# Altium footprint library SMT IC footprints.PcbLib: 363 footprints (part 13 of 23)
Each footprint in its own frame and in the unit in brackets; x right, y up, seen from the top. Pads: shape width x height; smd on the part's side, far side on the other; paste and mask are expansions set on the pad; w line width, h text height; cw(c..) or ccw(c..) is an arc to the next point about the centre after c.
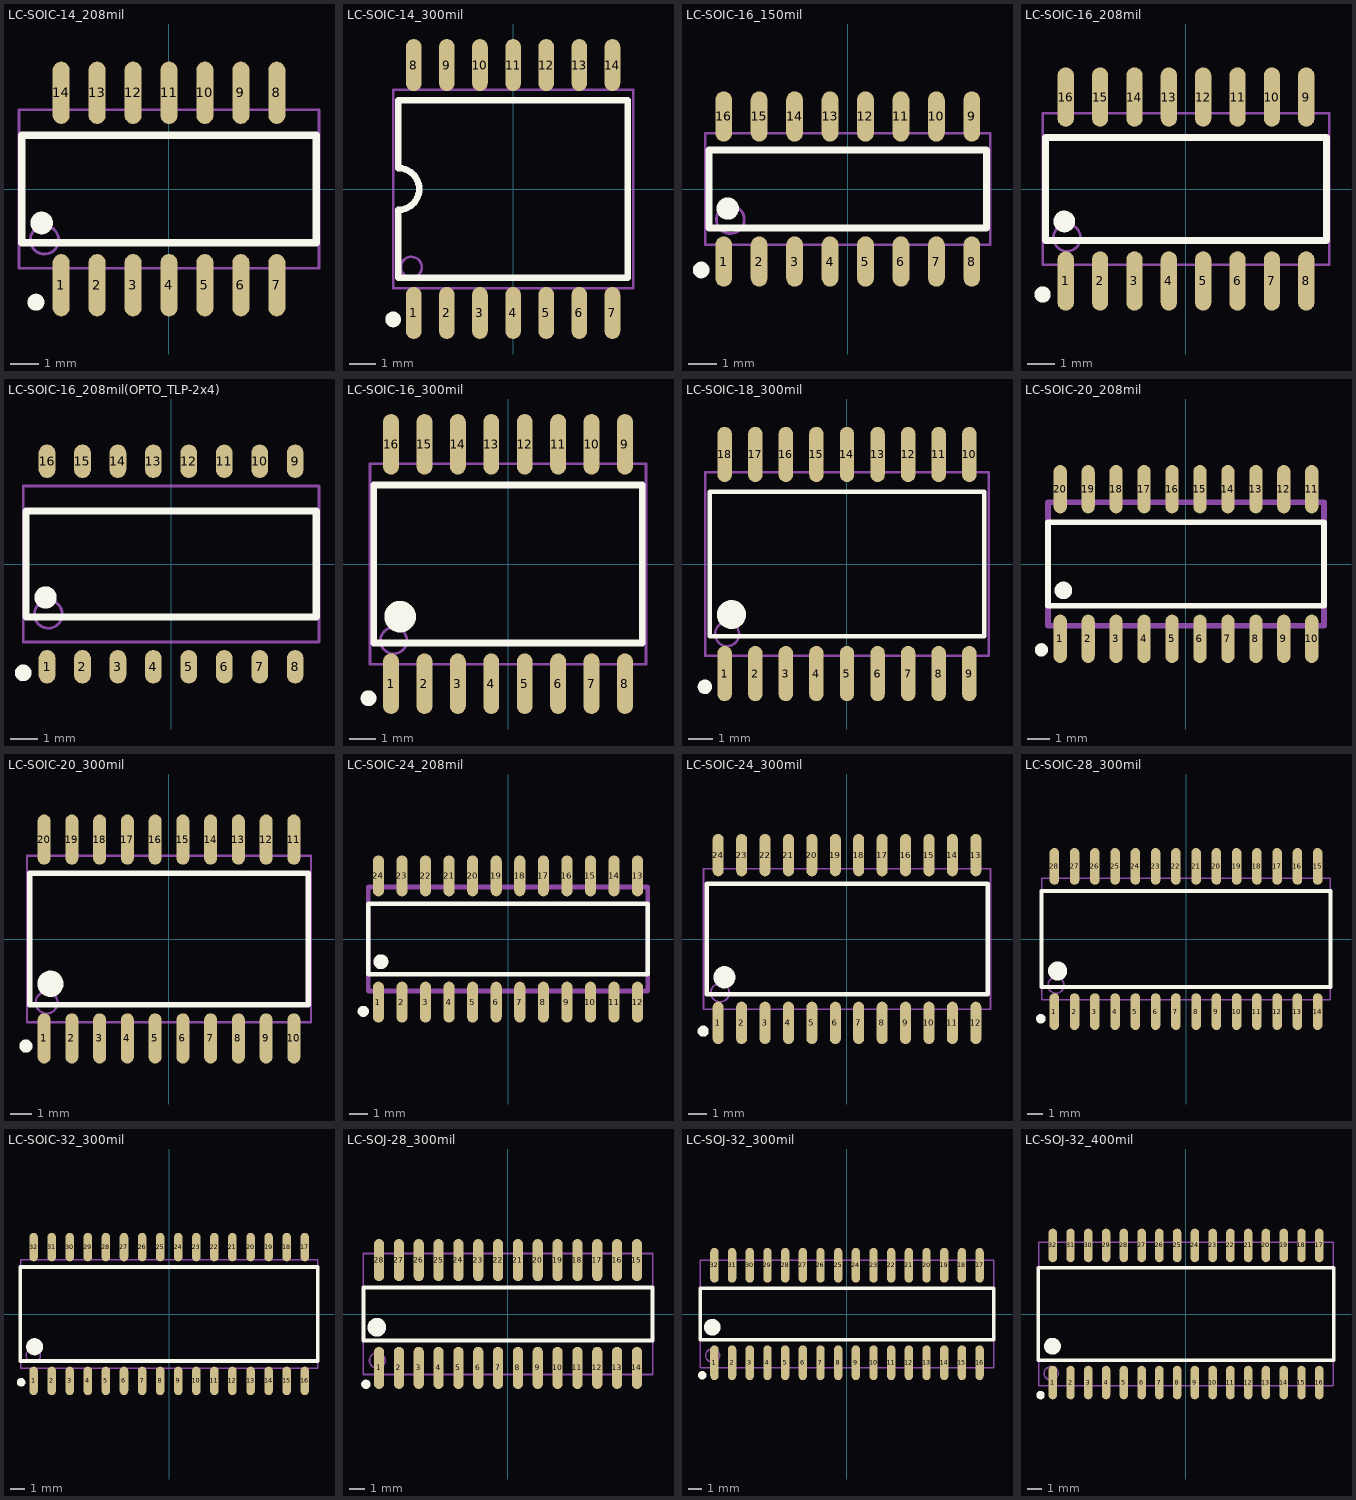
[diagram p12: the footprints below, top view; thin cyan lines are the x and y axes]

## LC-SOIC-14_208mil [mm]
pads (14):
  oval 0.6x2.2 smd: 1(-3.81,-3.4) 2(-2.54,-3.4) 3(-1.27,-3.4) 4(0,-3.4) 5(1.27,-3.4) 6(2.54,-3.4) 7(3.81,-3.4) 8(3.81,3.4) 9(2.54,3.4) 10(1.27,3.4) 11(0,3.4) 12(-1.27,3.4) 13(-2.54,3.4) 14(-3.81,3.4)
Top Overlay:
  circle w0.3: c-4.7,-4 r0.15
  circle w0.4: c-4.5,-1.2 r0.2
  lines w0.254: -5.2,-1.9 -5.2,1.9 5.2,1.9 5.2,-1.9 -5.2,-1.9
Mechanical 13:
  circle w0.1: c-4.4,-1.8 r0.5
  lines w0.1: -5.3,-2.8 -5.3,2.8 5.3,2.8 5.3,-2.8 -5.3,-2.8

## LC-SOIC-14_300mil [mm]
pads (14):
  oval 0.6x2 smd: 1(-3.81,-4.75) 2(-2.54,-4.75) 3(-1.27,-4.75) 4(0,-4.75) 5(1.27,-4.75) 6(2.54,-4.75) 7(3.81,-4.75) 8(-3.81,4.75) 9(-2.54,4.75) 10(-1.27,4.75) 11(0,4.75) 12(1.27,4.75) 13(2.54,4.75) 14(3.81,4.75)
Top Overlay:
  circle w0.3: c-4.6,-5 r0.15
  lines w0.254: -4.4,-3.4 -4.4,-0.8 ccw(c-4.4,0) -4.4,0.8 -4.4,3.4 4.4,3.4 4.4,-3.4 -4.4,-3.4
Mechanical 13:
  circle w0.1: c-3.9,-3 r0.4
  lines w0.1: -4.6,-3.8 -4.6,3.8 4.6,3.8 4.6,-3.8 -4.6,-3.8

## LC-SOIC-16_150mil [mm]
pads (16):
  oval 0.6x1.8 smd: 1(-4.445,-2.6) 2(-3.175,-2.6) 3(-1.905,-2.6) 4(-0.635,-2.6) 5(0.635,-2.6) 6(1.905,-2.6) 7(3.175,-2.6) 8(4.445,-2.6) 9(4.445,2.6) 10(3.175,2.6) 11(1.905,2.6) 12(0.635,2.6) 13(-0.635,2.6) 14(-1.905,2.6) 15(-3.175,2.6) 16(-4.445,2.6)
Top Overlay:
  circle w0.4: c-4.3,-0.7 r0.2
  circle w0.3: c-5.25,-2.9 r0.15
  lines w0.254: -4.975,-1.4 -4.975,1.4 4.975,1.4 4.975,-1.4 -4.975,-1.4
Mechanical 13:
  circle w0.1: c-4.205,-1.095 r0.5
  lines w0.1: -5.105,-1.995 -5.105,1.995 5.105,1.995 5.105,-1.995 -5.105,-1.995
3D body "SOIC-16-150mil.SLDPRT": height 1.4, standoff 0, extent -4.95,-3 4.95,3

## LC-SOIC-16_208mil [mm]
pads (16):
  oval 0.6x2.2 smd: 1(-4.445,-3.4) 2(-3.175,-3.4) 3(-1.905,-3.4) 4(-0.635,-3.4) 5(0.635,-3.4) 6(1.905,-3.4) 7(3.175,-3.4) 8(4.445,-3.4) 9(4.445,3.4) 10(3.175,3.4) 11(1.905,3.4) 12(0.635,3.4) 13(-0.635,3.4) 14(-1.905,3.4) 15(-3.175,3.4) 16(-4.445,3.4)
Top Overlay:
  circle w0.4: c-4.5,-1.2 r0.2
  circle w0.3: c-5.3,-3.9 r0.15
  lines w0.254: -5.2,-1.9 -5.2,1.9 5.2,1.9 5.2,-1.9 -5.2,-1.9
Mechanical 13:
  circle w0.1: c-4.4,-1.8 r0.5
  lines w0.1: -5.3,-2.8 -5.3,2.8 5.3,2.8 5.3,-2.8 -5.3,-2.8
3D body "SOP16_208mil (5.3mm)_Foot SOP16.sldprt": height 1.2, standoff 0, extent 4.23,2.647 4.66,3.957
3D body "SOP16_208mil (5.3mm)_Foot SOP16.sldprt": height 1.2, standoff 0, extent 2.96,2.647 3.39,3.957
3D body "SOP16_208mil (5.3mm)_Foot SOP16.sldprt": height 1.2, standoff 0, extent 1.69,2.647 2.12,3.957
3D body "SOP16_208mil (5.3mm)_Foot SOP16.sldprt": height 1.2, standoff 0, extent 0.42,2.647 0.85,3.957
3D body "SOP16_208mil (5.3mm)_Foot SOP16.sldprt": height 1.2, standoff 0, extent -0.85,2.647 -0.42,3.957
3D body "SOP16_208mil (5.3mm)_Foot SOP16.sldprt": height 1.2, standoff 0, extent -4.66,2.647 -4.23,3.957
3D body "SOP16_208mil (5.3mm)_Foot SOP16.sldprt": height 1.2, standoff 0, extent -3.39,2.647 -2.96,3.957
3D body "SOP16_208mil (5.3mm)_Foot SOP16.sldprt": height 1.2, standoff 0, extent -2.12,2.647 -1.69,3.957
3D body "SOP16_208mil (5.3mm)_Foot SOP16.sldprt": height 1.2, standoff 0, extent 1.69,-3.957 2.12,-2.647
3D body "SOP16_208mil (5.3mm)_Foot SOP16.sldprt": height 1.2, standoff 0, extent 2.96,-3.957 3.39,-2.647
3D body "SOP16_208mil (5.3mm)_Foot SOP16.sldprt": height 1.2, standoff 0, extent 4.23,-3.957 4.66,-2.647
3D body "SOP16_208mil (5.3mm)_Foot SOP16.sldprt": height 1.2, standoff 0, extent 0.42,-3.957 0.85,-2.647
3D body "SOP16_208mil (5.3mm)_Foot SOP16.sldprt": height 1.2, standoff 0, extent -0.85,-3.957 -0.42,-2.647
3D body "SOP16_208mil (5.3mm)_Foot SOP16.sldprt": height 1.2, standoff 0, extent -2.12,-3.957 -1.69,-2.647
3D body "SOP16_208mil (5.3mm)_Foot SOP16.sldprt": height 1.2, standoff 0, extent -3.39,-3.957 -2.96,-2.647
3D body "SOP16_208mil (5.3mm)_Foot SOP16.sldprt": height 1.2, standoff 0, extent -4.66,-3.957 -4.23,-2.647
3D body "SOP16_208mil (5.3mm)_SOP16 Body.sldprt": height 1.8, standoff 0, extent -5.1,-2.65 5.1,2.65

## LC-SOIC-16_208mil(OPTO_TLP-2x4) [mm]
pads (16):
  oval 0.6x1.2 smd: 1(-4.445,-3.683) 2(-3.175,-3.683) 3(-1.905,-3.683) 4(-0.635,-3.683) 5(0.635,-3.683) 6(1.905,-3.683) 7(3.175,-3.683) 8(4.445,-3.683) 9(4.445,3.683) 10(3.175,3.683) 11(1.905,3.683) 12(0.635,3.683) 13(-0.635,3.683) 14(-1.905,3.683) 15(-3.175,3.683) 16(-4.445,3.683)
Top Overlay:
  circle w0.4: c-4.5,-1.2 r0.2
  circle w0.3: c-5.3,-3.9 r0.15
  lines w0.254: -5.2,-1.9 -5.2,1.9 5.2,1.9 5.2,-1.9 -5.2,-1.9
Mechanical 13:
  circle w0.1: c-4.4,-1.8 r0.5
  lines w0.1: -5.3,-2.8 -5.3,2.8 5.3,2.8 5.3,-2.8 -5.3,-2.8
3D body "SOP16_208mil (5.3mm)_Foot SOP16.sldprt": height 1.2, standoff 0, extent 4.23,2.647 4.66,3.957
3D body "SOP16_208mil (5.3mm)_Foot SOP16.sldprt": height 1.2, standoff 0, extent 2.96,2.647 3.39,3.957
3D body "SOP16_208mil (5.3mm)_Foot SOP16.sldprt": height 1.2, standoff 0, extent 1.69,2.647 2.12,3.957
3D body "SOP16_208mil (5.3mm)_Foot SOP16.sldprt": height 1.2, standoff 0, extent 0.42,2.647 0.85,3.957
3D body "SOP16_208mil (5.3mm)_Foot SOP16.sldprt": height 1.2, standoff 0, extent -0.85,2.647 -0.42,3.957
3D body "SOP16_208mil (5.3mm)_Foot SOP16.sldprt": height 1.2, standoff 0, extent -4.66,2.647 -4.23,3.957
3D body "SOP16_208mil (5.3mm)_Foot SOP16.sldprt": height 1.2, standoff 0, extent -3.39,2.647 -2.96,3.957
3D body "SOP16_208mil (5.3mm)_Foot SOP16.sldprt": height 1.2, standoff 0, extent -2.12,2.647 -1.69,3.957
3D body "SOP16_208mil (5.3mm)_Foot SOP16.sldprt": height 1.2, standoff 0, extent 1.69,-3.957 2.12,-2.647
3D body "SOP16_208mil (5.3mm)_Foot SOP16.sldprt": height 1.2, standoff 0, extent 2.96,-3.957 3.39,-2.647
3D body "SOP16_208mil (5.3mm)_Foot SOP16.sldprt": height 1.2, standoff 0, extent 4.23,-3.957 4.66,-2.647
3D body "SOP16_208mil (5.3mm)_Foot SOP16.sldprt": height 1.2, standoff 0, extent 0.42,-3.957 0.85,-2.647
3D body "SOP16_208mil (5.3mm)_Foot SOP16.sldprt": height 1.2, standoff 0, extent -0.85,-3.957 -0.42,-2.647
3D body "SOP16_208mil (5.3mm)_Foot SOP16.sldprt": height 1.2, standoff 0, extent -2.12,-3.957 -1.69,-2.647
3D body "SOP16_208mil (5.3mm)_Foot SOP16.sldprt": height 1.2, standoff 0, extent -3.39,-3.957 -2.96,-2.647
3D body "SOP16_208mil (5.3mm)_Foot SOP16.sldprt": height 1.2, standoff 0, extent -4.66,-3.957 -4.23,-2.647
3D body "SOP16_208mil (5.3mm)_SOP16 Body.sldprt": height 1.8, standoff 0, extent -5.1,-2.65 5.1,2.65

## LC-SOIC-16_300mil [mm]
pads (16):
  oval 0.6x2.3 smd: 1(-4.445,-4.55) 2(-3.175,-4.55) 3(-1.905,-4.55) 4(-0.635,-4.55) 5(0.635,-4.55) 6(1.905,-4.55) 7(3.175,-4.55) 8(4.445,-4.55) 9(4.445,4.55) 10(3.175,4.55) 11(1.905,4.55) 12(0.635,4.55) 13(-0.635,4.55) 14(-1.905,4.55) 15(-3.175,4.55) 16(-4.445,4.55)
Top Overlay:
  circle w0.3: c-5.3,-5.1 r0.15
  circle w0.6: c-4.1,-2 r0.3
  lines w0.254: -5.1,-3 5.1,-3 5.1,3 -5.1,3 -5.1,-3
Mechanical 13:
  circle w0.1: c-4.345,-2.91 r0.5
  lines w0.1: -5.245,-3.81 5.245,-3.81 5.245,3.81 -5.245,3.81 -5.245,-3.81
3D body "SOIC-16-300_SOIC_300_SOIC_10.5X7.6_1.sldprt": height 2.47, standoff 0.13, extent -5.25,-3.8 5.25,3.8
3D body "SOIC-16-300_pin_SOIC_SO-300_1.sldprt": height 1.53, standoff -0.03, extent -4.65,-5.3 -4.25,-3.8
3D body "SOIC-16-300_pin_SOIC_SO-300_1.sldprt": height 1.53, standoff -0.03, extent -3.38,-5.3 -2.98,-3.8
3D body "SOIC-16-300_pin_SOIC_SO-300_1.sldprt": height 1.53, standoff -0.03, extent -2.11,-5.3 -1.71,-3.8
3D body "SOIC-16-300_pin_SOIC_SO-300_1.sldprt": height 1.53, standoff -0.03, extent -0.84,-5.3 -0.44,-3.8
3D body "SOIC-16-300_pin_SOIC_SO-300_1.sldprt": height 1.53, standoff -0.03, extent 0.43,-5.3 0.83,-3.8
3D body "SOIC-16-300_pin_SOIC_SO-300_1.sldprt": height 1.53, standoff -0.03, extent 1.7,-5.3 2.1,-3.8
3D body "SOIC-16-300_pin_SOIC_SO-300_1.sldprt": height 1.53, standoff -0.03, extent 2.97,-5.3 3.37,-3.8
3D body "SOIC-16-300_pin_SOIC_SO-300_1.sldprt": height 1.53, standoff -0.03, extent 4.24,-5.3 4.64,-3.8
3D body "SOIC-16-300_pin_SOIC_SO-300_1.sldprt": height 1.53, standoff -0.03, extent 4.25,3.8 4.65,5.3
3D body "SOIC-16-300_pin_SOIC_SO-300_1.sldprt": height 1.53, standoff -0.03, extent 2.98,3.8 3.38,5.3
3D body "SOIC-16-300_pin_SOIC_SO-300_1.sldprt": height 1.53, standoff -0.03, extent 1.71,3.8 2.11,5.3
3D body "SOIC-16-300_pin_SOIC_SO-300_1.sldprt": height 1.53, standoff -0.03, extent 0.44,3.8 0.84,5.3
3D body "SOIC-16-300_pin_SOIC_SO-300_1.sldprt": height 1.53, standoff -0.03, extent -0.83,3.8 -0.43,5.3
3D body "SOIC-16-300_pin_SOIC_SO-300_1.sldprt": height 1.53, standoff -0.03, extent -2.1,3.8 -1.7,5.3
3D body "SOIC-16-300_pin_SOIC_SO-300_1.sldprt": height 1.53, standoff -0.03, extent -3.37,3.8 -2.97,5.3
3D body "SOIC-16-300_pin_SOIC_SO-300_1.sldprt": height 1.53, standoff -0.03, extent -4.64,3.8 -4.24,5.3

## LC-SOIC-18_300mil [mm]
pads (18):
  oval 0.6x2.3 smd: 1(-5.08,-4.55) 2(-3.81,-4.55) 3(-2.54,-4.55) 4(-1.27,-4.55) 5(0,-4.55) 6(1.27,-4.55) 7(2.54,-4.55) 8(3.81,-4.55) 9(5.08,-4.55) 10(5.08,4.55) 11(3.81,4.55) 12(2.54,4.55) 13(1.27,4.55) 14(0,4.55) 15(-1.27,4.55) 16(-2.54,4.55) 17(-3.81,4.55) 18(-5.08,4.55)
Top Overlay:
  circle w0.6: c-4.8,-2.1 r0.3
  circle w0.3: c-5.9,-5.1 r0.15
  lines w0.2: -5.7,-3 5.7,-3 5.7,3 -5.7,3 -5.7,-3
Mechanical 13:
  circle w0.1: c-4.98,-2.91 r0.5
  lines w0.1: -5.88,-3.81 -5.88,3.81 5.88,3.81 5.88,-3.81 -5.88,-3.81
3D body "SOIC-18-300mil.sldprt": height 2.47, standoff 0.13, extent -5.875,-3.8 5.875,3.8
3D body "SOIC-18-300mil pin.sldprt": height 1.53, standoff -0.03, extent -5.28,-5.309 -4.88,-3.809
3D body "SOIC-18-300mil pin.sldprt": height 1.53, standoff -0.03, extent -4.01,-5.309 -3.61,-3.809
3D body "SOIC-18-300mil pin.sldprt": height 1.53, standoff -0.03, extent -2.74,-5.309 -2.34,-3.809
3D body "SOIC-18-300mil pin.sldprt": height 1.53, standoff -0.03, extent -1.47,-5.309 -1.07,-3.809
3D body "SOIC-18-300mil pin.sldprt": height 1.53, standoff -0.03, extent 3.61,-5.309 4.01,-3.809
3D body "SOIC-18-300mil pin.sldprt": height 1.53, standoff -0.03, extent 2.34,-5.309 2.74,-3.809
3D body "SOIC-18-300mil pin.sldprt": height 1.53, standoff -0.03, extent 1.07,-5.309 1.47,-3.809
3D body "SOIC-18-300mil pin.sldprt": height 1.53, standoff -0.03, extent -0.2,-5.309 0.2,-3.809
3D body "SOIC-18-300mil pin.sldprt": height 1.53, standoff -0.03, extent 4.88,-5.309 5.28,-3.809
3D body "SOIC-18-300mil pin.sldprt": height 1.53, standoff -0.03, extent -5.28,3.809 -4.88,5.309
3D body "SOIC-18-300mil pin.sldprt": height 1.53, standoff -0.03, extent -0.2,3.809 0.2,5.309
3D body "SOIC-18-300mil pin.sldprt": height 1.53, standoff -0.03, extent -1.47,3.809 -1.07,5.309
3D body "SOIC-18-300mil pin.sldprt": height 1.53, standoff -0.03, extent -2.74,3.809 -2.34,5.309
3D body "SOIC-18-300mil pin.sldprt": height 1.53, standoff -0.03, extent -4.01,3.809 -3.61,5.309
3D body "SOIC-18-300mil pin.sldprt": height 1.53, standoff -0.03, extent 1.07,3.809 1.47,5.309
3D body "SOIC-18-300mil pin.sldprt": height 1.53, standoff -0.03, extent 2.34,3.809 2.74,5.309
3D body "SOIC-18-300mil pin.sldprt": height 1.53, standoff -0.03, extent 3.61,3.809 4.01,5.309
3D body "SOIC-18-300mil pin.sldprt": height 1.53, standoff -0.03, extent 4.88,3.809 5.28,5.309

## LC-SOIC-20_208mil [mm]
pads (20):
  oval 0.6x2.2 smd: 1(-5.715,-3.4) 2(-4.445,-3.4) 3(-3.175,-3.4) 4(-1.905,-3.4) 5(-0.635,-3.4) 6(0.635,-3.4) 7(1.905,-3.4) 8(3.175,-3.4) 9(4.445,-3.4) 10(5.715,-3.4) 11(5.715,3.4) 12(4.445,3.4) 13(3.175,3.4) 14(1.905,3.4) 15(0.635,3.4) 16(-0.635,3.4) 17(-1.905,3.4) 18(-3.175,3.4) 19(-4.445,3.4) 20(-5.715,3.4)
Top Overlay:
  circle w0.4: c-5.57,-1.2 r0.2
  circle w0.3: c-6.57,-3.9 r0.15
  lines w0.254: -6.27,-1.9 -6.27,1.9 6.27,1.9 6.27,-1.9 -6.27,-1.9
Mechanical 13:
  lines w0.254: -6.27,-2.8 -6.27,2.8 6.27,2.8 6.27,-2.8 -6.27,-2.8
3D body "SOIC-20-208mil.SLDPRT": height 2, standoff 0, extent -6.45,-3.9 6.45,3.9

## LC-SOIC-20_300mil [mm]
pads (20):
  oval 0.6x2.3 smd: 1(-5.715,-4.55) 2(-4.445,-4.55) 3(-3.175,-4.55) 4(-1.905,-4.55) 5(-0.635,-4.55) 6(0.635,-4.55) 7(1.905,-4.55) 8(3.175,-4.55) 9(4.445,-4.55) 10(5.715,-4.55) 11(5.715,4.55) 12(4.445,4.55) 13(3.175,4.55) 14(1.905,4.55) 15(0.635,4.55) 16(-0.635,4.55) 17(-1.905,4.55) 18(-3.175,4.55) 19(-4.445,4.55) 20(-5.715,4.55)
Top Overlay:
  circle w0.3: c-6.55,-4.9 r0.15
  circle w0.6: c-5.425,-2.05 r0.3
  lines w0.254: -6.375,-3 -6.375,3 6.375,3 6.375,-3 -6.375,-3
Mechanical 13:
  circle w0.1: c-5.6,-2.91 r0.5
  lines w0.1: -6.5,-3.81 -6.5,3.81 6.5,3.81 6.5,-3.81 -6.5,-3.81
3D body "SOIC-20-300mil.SLDPRT": height 2.66, standoff 0, extent -6.5,-5.315 6.5,5.315

## LC-SOIC-24_208mil [mm]
pads (24):
  oval 0.6x2.2 smd: 1(-6.985,-3.4) 2(-5.715,-3.4) 3(-4.445,-3.4) 4(-3.175,-3.4) 5(-1.905,-3.4) 6(-0.635,-3.4) 7(0.635,-3.4) 8(1.905,-3.4) 9(3.175,-3.4) 10(4.445,-3.4) 11(5.715,-3.4) 12(6.985,-3.4) 13(6.985,3.4) 14(5.715,3.4) 15(4.445,3.4) 16(3.175,3.4) 17(1.905,3.4) 18(0.635,3.4) 19(-0.635,3.4) 20(-1.905,3.4) 21(-3.175,3.4) 22(-4.445,3.4) 23(-5.715,3.4) 24(-6.985,3.4)
Top Overlay:
  circle w0.3: c-7.8,-3.9 r0.15
  circle w0.4: c-6.85,-1.225 r0.2
  lines w0.254: -7.54,-1.9 7.54,-1.9 7.54,1.9 -7.54,1.9 -7.54,-1.9
Mechanical 13:
  lines w0.254: -7.54,-2.8 7.54,-2.8 7.54,2.8 -7.54,2.8 -7.54,-2.8

## LC-SOIC-24_300mil [mm]
pads (24):
  oval 0.6x2.3 smd: 1(-6.985,-4.55) 2(-5.715,-4.55) 3(-4.445,-4.55) 4(-3.175,-4.55) 5(-1.905,-4.55) 6(-0.635,-4.55) 7(0.635,-4.55) 8(1.905,-4.55) 9(3.175,-4.55) 10(4.445,-4.55) 11(5.715,-4.55) 12(6.985,-4.55) 13(6.985,4.55) 14(5.715,4.55) 15(4.445,4.55) 16(3.175,4.55) 17(1.905,4.55) 18(0.635,4.55) 19(-0.635,4.55) 20(-1.905,4.55) 21(-3.175,4.55) 22(-4.445,4.55) 23(-5.715,4.55) 24(-6.985,4.55)
Top Overlay:
  circle w0.6: c-6.65,-2.075 r0.3
  circle w0.3: c-7.8,-5 r0.15
  lines w0.254: -7.6,-3 -7.6,3 7.625,3 7.625,-3 -7.6,-3
Mechanical 13:
  circle w0.1: c-6.885,-2.91 r0.5
  lines w0.1: -7.785,-3.81 -7.785,3.81 7.785,3.81 7.785,-3.81 -7.785,-3.81
3D body "SOIC-24-300.SLDPRT": height 2.65, standoff 0, extent -7.75,-5.15 7.75,5.15

## LC-SOIC-28_300mil [mm]
pads (28):
  oval 0.6x2.3 smd: 1(-8.255,-4.55) 2(-6.985,-4.55) 3(-5.715,-4.55) 4(-4.445,-4.55) 5(-3.175,-4.55) 6(-1.905,-4.55) 7(-0.635,-4.55) 8(0.635,-4.55) 9(1.905,-4.55) 10(3.175,-4.55) 11(4.445,-4.55) 12(5.715,-4.55) 13(6.985,-4.55) 14(8.255,-4.55) 15(8.255,4.55) 16(6.985,4.55) 17(5.715,4.55) 18(4.445,4.55) 19(3.175,4.55) 20(1.905,4.55) 21(0.635,4.55) 22(-0.635,4.55) 23(-1.905,4.55) 24(-3.175,4.55) 25(-4.445,4.55) 26(-5.715,4.55) 27(-6.985,4.55) 28(-8.255,4.55)
Top Overlay:
  circle w0.3: c-9.1,-5 r0.15
  circle w0.6: c-8.05,-2 r0.3
  lines w0.254: -9.05,-3 -9.05,3 9.05,3 9.05,-3 -9.05,-3
Mechanical 13:
  circle w0.1: c-8.15,-2.9 r0.5
  lines w0.1: -9.05,-3.8 -9.05,3.8 9.05,3.8 9.05,-3.8 -9.05,-3.8

## LC-SOIC-32_300mil [mm]
pads (32):
  oval 0.6x2 smd: 1(-9.525,-4.7) 2(-8.255,-4.7) 3(-6.985,-4.7) 4(-5.715,-4.7) 5(-4.445,-4.7) 6(-3.175,-4.7) 7(-1.905,-4.7) 8(-0.635,-4.7) 9(0.635,-4.7) 10(1.905,-4.7) 11(3.175,-4.7) 12(4.445,-4.7) 13(5.715,-4.7) 14(6.985,-4.7) 15(8.255,-4.7) 16(9.525,-4.7) 17(9.525,4.7) 18(8.255,4.7) 19(6.985,4.7) 20(5.715,4.7) 21(4.445,4.7) 22(3.175,4.7) 23(1.905,4.7) 24(0.635,4.7) 25(-0.635,4.7) 26(-1.905,4.7) 27(-3.175,4.7) 28(-4.445,4.7) 29(-5.715,4.7) 30(-6.985,4.7) 31(-8.255,4.7) 32(-9.525,4.7)
Top Overlay:
  circle w0.6: c-9.45,-2.3 r0.3
  circle w0.3: c-10.4,-4.8 r0.15
  lines w0.254: -10.45,-3.3 -10.45,3.3 10.45,3.3 10.45,-3.3 -10.45,-3.3
Mechanical 13:
  circle w0.1: c-9.54,-2.9 r0.5
  lines w0.1: -10.44,-3.8 -10.44,3.8 10.44,3.8 10.44,-3.8 -10.44,-3.8

## LC-SOJ-28_300mil [mm]
pads (28):
  oval 0.65x2.7 smd: 1(-8.255,-3.45) 2(-6.985,-3.45) 3(-5.715,-3.45) 4(-4.445,-3.45) 5(-3.175,-3.45) 6(-1.905,-3.45) 7(-0.635,-3.45) 8(0.635,-3.45) 9(1.905,-3.45) 10(3.175,-3.45) 11(4.445,-3.45) 12(5.715,-3.45) 13(6.985,-3.45) 14(8.255,-3.45) 15(8.255,3.45) 16(6.985,3.45) 17(5.715,3.45) 18(4.445,3.45) 19(3.175,3.45) 20(1.905,3.45) 21(0.635,3.45) 22(-0.635,3.45) 23(-1.905,3.45) 24(-3.175,3.45) 25(-4.445,3.45) 26(-5.715,3.45) 27(-6.985,3.45) 28(-8.255,3.45)
Top Overlay:
  circle w0.6: c-8.4,-0.85 r0.3
  circle w0.3: c-9.1,-4.5 r0.15
  lines w0.254: -9.25,-1.7 9.25,-1.7 9.25,1.7 -9.25,1.7 -9.25,-1.7
Mechanical 13:
  circle w0.1: c-8.37,-2.975 r0.5
  lines w0.1: -9.27,-3.875 9.27,-3.875 9.27,3.875 -9.27,3.875 -9.27,-3.875

## LC-SOJ-32_300mil [mm]
pads (32):
  oval 0.6x2.5 smd: 1(-9.525,-3.5) 2(-8.255,-3.5) 3(-6.985,-3.5) 4(-5.715,-3.5) 5(-4.445,-3.5) 6(-3.175,-3.5) 7(-1.905,-3.5) 8(-0.635,-3.5) 9(0.635,-3.5) 10(1.905,-3.5) 11(3.175,-3.5) 12(4.445,-3.5) 13(5.715,-3.5) 14(6.985,-3.5) 15(8.255,-3.5) 16(9.525,-3.5) 17(9.525,3.5) 18(8.255,3.5) 19(6.985,3.5) 20(5.715,3.5) 21(4.445,3.5) 22(3.175,3.5) 23(1.905,3.5) 24(0.635,3.5) 25(-0.635,3.5) 26(-1.905,3.5) 27(-3.175,3.5) 28(-4.445,3.5) 29(-5.715,3.5) 30(-6.985,3.5) 31(-8.255,3.5) 32(-9.525,3.5)
Top Overlay:
  circle w0.3: c-10.4,-4.4 r0.15
  circle w0.6: c-9.675,-0.95 r0.3
  lines w0.254: -10.55,-1.85 10.55,-1.85 10.55,1.85 -10.55,1.85 -10.55,-1.85
Mechanical 13:
  circle w0.1: c-9.645,-2.975 r0.5
  lines w0.1: -10.545,-3.875 10.545,-3.875 10.545,3.875 -10.545,3.875 -10.545,-3.875

## LC-SOJ-32_400mil [mm]
pads (32):
  oval 0.6x2.4 smd: 1(-9.525,-4.9) 2(-8.255,-4.9) 3(-6.985,-4.9) 4(-5.715,-4.9) 5(-4.445,-4.9) 6(-3.175,-4.9) 7(-1.905,-4.9) 8(-0.635,-4.9) 9(0.635,-4.9) 10(1.905,-4.9) 11(3.175,-4.9) 12(4.445,-4.9) 13(5.715,-4.9) 14(6.985,-4.9) 15(8.255,-4.9) 16(9.525,-4.9) 17(9.525,4.9) 18(8.255,4.9) 19(6.985,4.9) 20(5.715,4.9) 21(4.445,4.9) 22(3.175,4.9) 23(1.905,4.9) 24(0.635,4.9) 25(-0.635,4.9) 26(-1.905,4.9) 27(-3.175,4.9) 28(-4.445,4.9) 29(-5.715,4.9) 30(-6.985,4.9) 31(-8.255,4.9) 32(-9.525,4.9)
Top Overlay:
  circle w0.6: c-9.55,-2.3 r0.3
  circle w0.3: c-10.4,-5.8 r0.15
  lines w0.254: -10.55,-3.3 -10.55,3.3 10.55,3.3 10.55,-3.3 -10.55,-3.3
Mechanical 13:
  circle w0.1: c-9.64,-4.245 r0.5
  lines w0.1: -10.54,-5.145 -10.54,5.145 10.54,5.145 10.54,-5.145 -10.54,-5.145